# Altium footprint library Dr.Xiong_20160818.PcbLib: 266 footprints (part 7 of 17)
Each footprint in its own frame and in the unit in brackets; x right, y up, seen from the top. Pads: shape width x height; smd on the part's side, far side on the other; paste and mask are expansions set on the pad; w line width, h text height; cw(c..) or ccw(c..) is an arc to the next point about the centre after c.
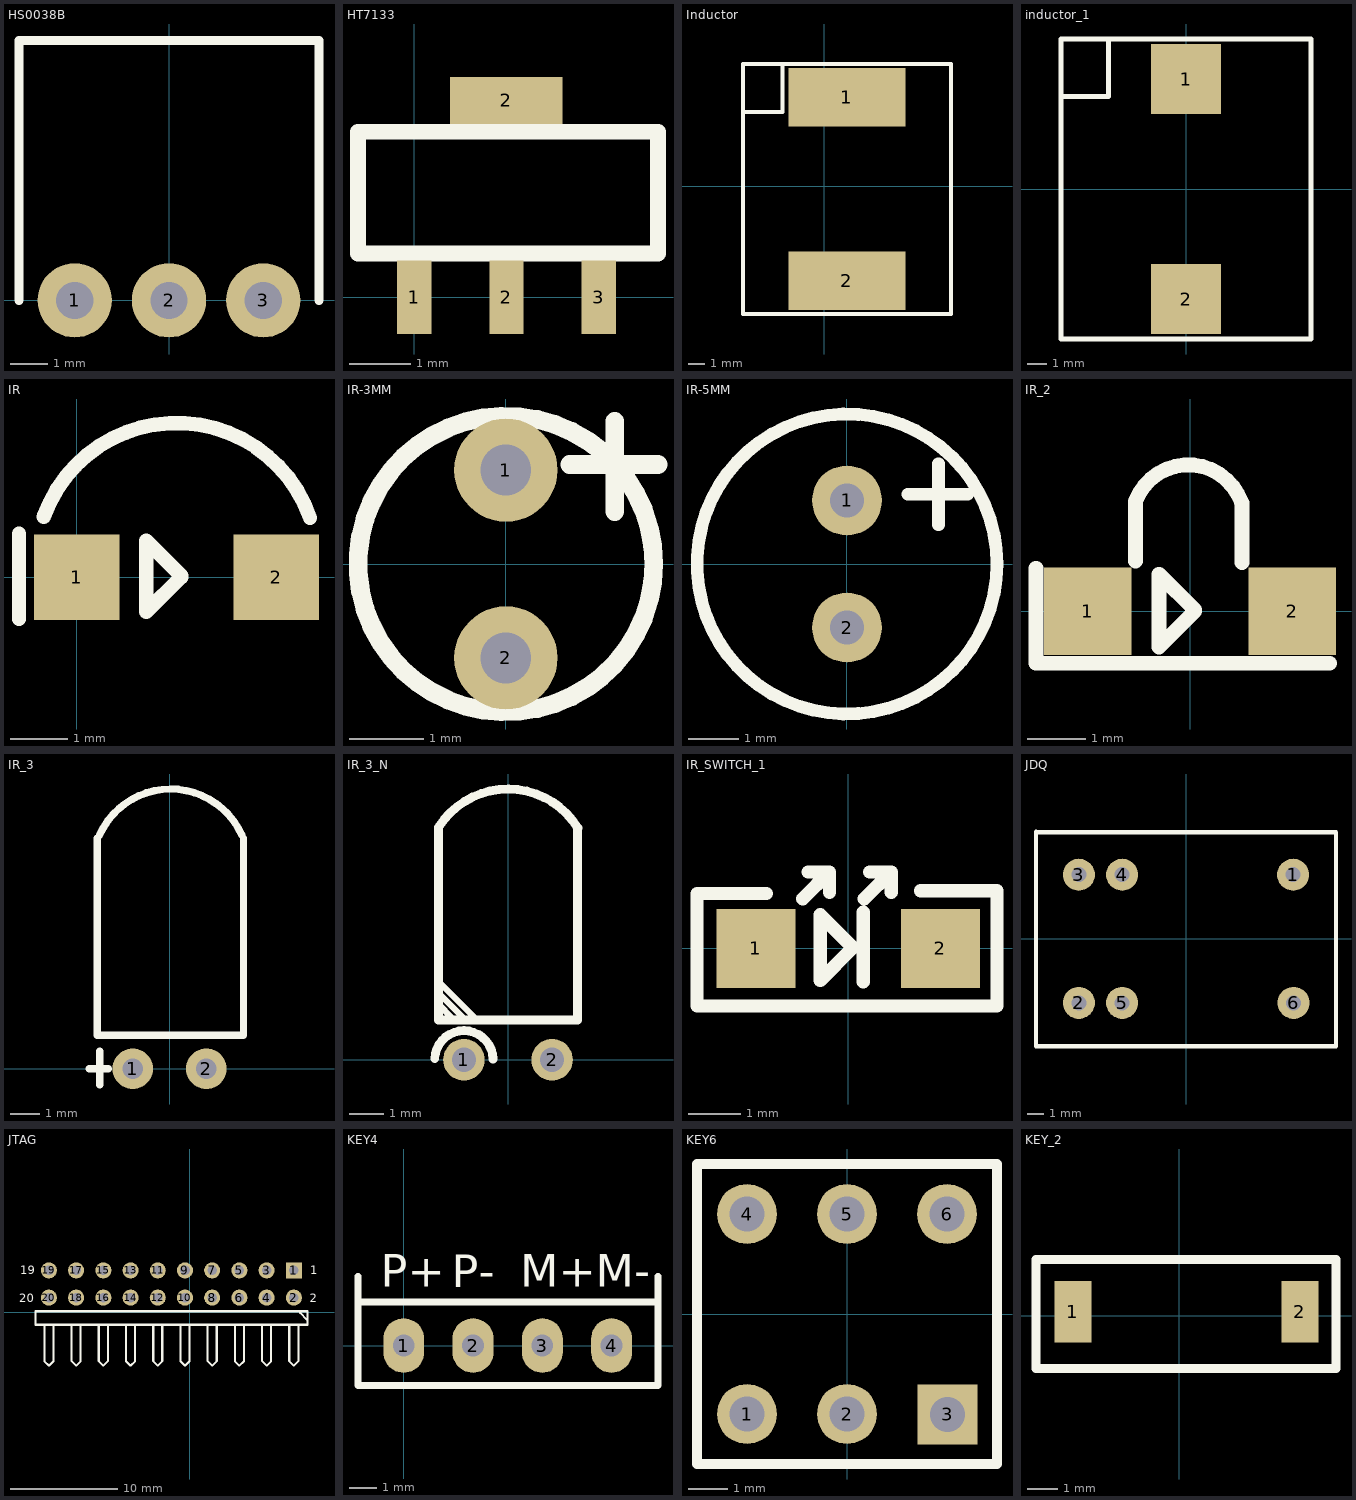
[diagram p6: the footprints below, top view; thin cyan lines are the x and y axes]

## HS0038B [mm]
pads (3):
  round 2 hole 1: 1(-2.54,0) 2(0,0) 3(2.54,0)
Top Overlay:
  lines w0.254: -4.04,0 -4.04,7 4.04,7 4.04,0

## HT7133 [mil]
pads (4):
  rect 22x47 smd: 1(0,0) 2(59,0) 3(118,0)
  rect 72x30 smd: 2(59,126)
Top Overlay:
  lines w10: -31,106 -18,106 147,106 ; -29,106 -36,106 -36,28 156,28 156,106 149,106

## Inductor [mil]
pads (2):
  rect 280x140 smd: 1(55.12,213.11) 2(55.12,-226.89)
Top Overlay:
  lines w10: -194.88,178.11 -99.88,178.11 -99.88,293.11 ; 130.12,293.11 305.12,293.11 305.12,-306.89 130.12,-306.89 -194.88,-306.89 -194.88,293.11 135.12,293.11

## inductor_1 [mil]
pads (2):
  rect 140x140 smd: 1(0,220) 2(0,-220)
Top Overlay:
  lines w10: -250,185 -155,185 -155,300 ; 75,300 250,300 250,-300 75,-300 -250,-300 -250,300 80,300

## IR [mm]
pads (2):
  rect 1.5x1.5 smd: 1(0,0) 2(3.5,0)
Top Overlay:
  lines w0.254: -1.016,-0.737 -1.016,0.763 ; -0.58,1.06 cw(c1.753,0.229) 4.092,1.042 ; 1.219,0.635 1.219,-0.61 1.829,0 1.803,0 ; 1.245,0.61 1.829,0.025

## IR-3MM [mil]
pads (2):
  round 55 hole 27: 1(0,50) 2(0,-50)
Top Overlay:
  circle w10: c0,0 r78.74
  lines w10: 34,53 81,53 ; 58,28 58,76

## IR-5MM [mil]
pads (2):
  round 55 hole 27: 1(0,50) 2(0,-50)
Top Overlay:
  circle w10: c0,0 r118.11
  lines w10: 48,55 95,55 ; 72,31 72,79

## IR_2 [mm]
pads (2):
  rect 1.5x1.5 smd: 1(-1.75,0) 2(1.75,0)
Top Overlay:
  lines w0.254: -2.639,0.737 -2.639,-0.889 2.39,-0.889 ; -0.937,0.864 -0.937,1.88 cw(c-0.031,1.543) 0.882,1.863 ; -0.531,0.635 -0.531,-0.61 0.079,0 0.053,0 ; -0.505,0.61 0.079,0.025 ; 0.892,0.838 0.892,1.854

## IR_3 [mm]
pads (2):
  round 1.4 hole 0.7: 1(-1.27,0) 2(1.27,0)
Top Overlay:
  lines w0.254: -2.769,0 -2.108,0 ; -2.502,7.95 -2.502,1.15 2.498,1.15 ; -2.42,8.061 cw(c0.038,6.963) 2.489,8.077 ; -2.413,-0.559 -2.413,0.61 ; 2.553,1.15 2.553,7.95

## IR_3_N [mm]
pads (2):
  round 1.2 hole 0.7: 1(-1.27,0) 2(1.27,0)
Top Overlay:
  lines w0.178: -2,1.626 -2,1.594 -1.6,1.194 ; -2,1.905 -1.981,1.905 -1.194,1.118 ; -2,2.362 -2,2.254 -0.914,1.168
  lines w0.254: -2.11,0.03 cw(c-1.27,0) -0.43,0.027 ; -2.001,6.7 cw(c0,5.436) 2.013,6.681 ; -2,6.655 -2,1.15 2,1.15 2,6.655

## IR_SWITCH_1 [mm]
pads (2):
  rect 1.5x1.5 smd: 1(-1.75,0) 2(1.75,0)
Top Overlay:
  lines w0.254: -1.549,1.041 -2.868,1.041 -2.868,-1.092 2.822,-1.092 2.822,1.092 1.372,1.092 ; -0.864,0.94 -0.356,1.448 ; -0.762,1.448 -0.356,1.448 ; -0.531,0.635 -0.531,-0.61 0.079,0 0.053,0 ; -0.505,0.61 0.079,0.025 ; -0.356,1.067 -0.356,1.448 ; 0.282,-0.635 0.282,0.686 ; 0.305,0.94 0.813,1.448 ; 0.406,1.448 0.813,1.448 ; 0.813,1.067 0.813,1.448

## JDQ [mil]
pads (6):
  round 75 hole 35: 1(249.5,149.5) 2(-250.5,-149.5) 3(-250.5,149.5) 4(-149.5,149.5) 5(-149.5,-149.5) 6(250.5,-149.5)
Top Overlay:
  lines w10: -350.5,-250.5 -350.5,249.5 -349.5,248.5 349.5,248.5 349.5,-250.5 -350.5,-250.5

## JTAG [mm]
pads (20):
  rect 1.5x1.5 hole 0.9: 1(9.703,3.912)
  round 1.5 hole 0.9: 2(9.703,1.372) 3(7.163,3.912) 4(7.163,1.372) 5(4.623,3.912) 6(4.623,1.372) 7(2.083,3.912) 8(2.083,1.372) 9(-0.457,3.912) 10(-0.457,1.372) 11(-2.997,3.912) 12(-2.997,1.372) 13(-5.537,3.912) 14(-5.537,1.372) 15(-8.077,3.912) 16(-8.077,1.372) 17(-10.617,3.912) 18(-10.617,1.372) 19(-13.157,3.912) 20(-13.157,1.372)
Top Overlay:
  lines w0.2: -13.581,-1.168 -13.581,-4.555 -13.157,-4.978 -12.734,-4.555 -12.734,-1.168 ; -11.041,-1.168 -11.041,-4.555 -10.617,-4.978 -10.194,-4.555 -10.194,-1.168 ; -8.501,-1.168 -8.501,-4.555 -8.077,-4.978 -7.654,-4.555 -7.654,-1.168 ; -5.961,-1.168 -5.961,-4.555 -5.537,-4.978 -5.114,-4.555 -5.114,-1.168 ; -3.421,-1.168 -3.421,-4.555 -2.997,-4.978 -2.574,-4.555 -2.574,-1.168 ; -0.881,-1.168 -0.881,-4.555 -0.457,-4.978 -0.034,-4.555 -0.034,-1.168 ; 1.659,-1.168 1.659,-4.555 2.083,-4.978 2.506,-4.555 2.506,-1.168 ; 4.199,-1.168 4.199,-4.555 4.623,-4.978 5.046,-4.555 5.046,-1.168 ; 6.739,-1.168 6.739,-4.555 7.163,-4.978 7.586,-4.555 7.586,-1.168 ; 9.279,-1.168 9.279,-4.555 9.703,-4.978 10.126,-4.555 10.126,-1.168 ; 10.287,-0.051 10.922,-0.686 ; -14.427,-1.168 10.973,-1.168 10.973,0.102 -14.427,0.102 -14.427,-1.168
  text "20" at -15.951,0.94 h0.8
  text "19" at -15.85,3.531 h0.8
  text "2" at 11.176,0.94 h0.8
  text "1" at 11.252,3.531 h0.8

## KEY4 [mm]
pads (4):
  oval 1.5x2 hole 0.8: 1(0,0) 2(2.54,0) 3(5.08,0) 4(7.62,0)
Top Overlay:
  lines w0.254: -1.676,-1.473 -1.676,2.54 ; -1.651,-1.473 9.322,-1.473 9.322,2.54 ; -1.6,1.6 9.322,1.6
  text "M-" at 7.036,1.753 h2.03
  text "M+" at 4.267,1.753 h2.03
  text "P-" at 1.753,1.727 h2.03
  text "P+" at -0.838,1.753 h2.03

## KEY6 [mil]
pads (6):
  round 60 hole 35: 1(-100.25,-99.86) 2(-0.25,-99.86) 4(-100.25,100.14) 5(-0.25,100.14) 6(99.75,100.14)
  rect 60x60 hole 35: 3(100.25,-100.14)
Top Overlay:
  lines w10: -150.25,-149.85 -150.25,150.15 149.75,150.15 149.75,-149.85 -150.25,-149.85

## KEY_2 [mm]
pads (2):
  rect 1.2x2 smd: 1(-3.471,0.127) 2(3.929,0.127)
Top Overlay:
  lines w0.305: 5.105,-1.727 -4.674,-1.727 -4.674,1.829 5.105,1.829 ; 5.105,-1.626 5.105,1.803